# Altium schematic symbol library TI Power Management Shunt Voltage Reference.SchLib: 1526 symbols (part 14 of 18) (continued)
## TLV431BCLPRE3
designator U?
Low-Voltage Adjustable Precision Shunt Regulator, 15 mA, 0 to 70 degC, 3-pin TO-92 (LP), Pb-Free (RoHS); Manufacturer: Texas Instruments; PartNumber: TLV431BCLPRE3; Initial Accuracy @ 25/deg C(%): 0.5; Iout/Iz(Max)(mA): 15; Min Iz for Regulation(uA): 80; Rating: Catalog; SubFamily: Shunt Voltage Reference; Temp Coeff(Max)(ppm/ degree C): 129; VO Adj(Max)(V): 6; VO Adj(Min)(V): 1.24; DatasheetVersion: SLVS139T; PackageVersion: 4040001-2/C; PackageReference: LP3; PackageDescription: Plastic Cylindrical Package, Formed Lead Option (TO-92); Supplier 1: Digi-Key; Supplier Part Number 1: TLV431BCLPRE3-ND; Supplier 2: Mouser; Supplier Part Number 2: 595-TLV431BCLPRE3; Eco-Plan: Pb-Free (RoHS); Mounting Technology: Through Hole; Code_JEDEC: TO-226; ComponentLink1Description: Manufacturer URL; ComponentLink1URL: http://www.ti.com/; ComponentLink2Description: Datasheet; ComponentLink2URL: http://www.ti.com/general/docs/lit/getliterature.tsp?genericPartNumber=TLV431B&fileType=pdf; ComponentLink3Description: Package Specification; ComponentLink3URL: http://www.ti.com/litv/pdf/msot002a; ComponentLink4Description: URL Link1; ComponentLink4URL: Samples URL:http://www.ti.com/general/docs/lit/getliterature.tsp?genericPartNumber=tlv431b&fileType=pdf
footprint TI-LP3 (TO, Flat Index; 3 In-Line, Formed Axial Leads; Body Dia. 4.8mm; Leads 0.56 x 0.41 mm (max))
pins: 1 REF (in), 2 ANODE, 3 CATHODE

## TLV431BCPK
designator U?
Low-Voltage Adjustable Precision Shunt Regulator, 15 mA, 0 to 70 degC, 3-pin SOT-89 (PK), Green (RoHS & no Sb/Br); Manufacturer: Texas Instruments; PartNumber: TLV431BCPK; Initial Accuracy @ 25/deg C(%): 0.5; Iout/Iz(Max)(mA): 15; Min Iz for Regulation(uA): 80; Rating: Catalog; SubFamily: Shunt Voltage Reference; Temp Coeff(Max)(ppm/ degree C): 129; VO Adj(Max)(V): 6; VO Adj(Min)(V): 1.24; DatasheetVersion: SLVS139T; PackageVersion: 4040234/D; PackageReference: PK3; PackageDescription: 3-Pin Plastic Small Outline, Body 2.5 x 4.5 mm, Pitch 1.5 mm; Supplier 1: Digi-Key; Supplier Part Number 1: 296-22934-5-ND; Supplier 2: Mouser; Supplier Part Number 2: 595-TLV431BCPK; Eco-Plan: Green (RoHS & no Sb/Br); Mounting Technology: Surface Mount; Code_JEDEC: TO-243; ComponentLink1Description: Manufacturer URL; ComponentLink1URL: http://www.ti.com/; ComponentLink2Description: Datasheet; ComponentLink2URL: http://www.ti.com/general/docs/lit/getliterature.tsp?genericPartNumber=TLV431B&fileType=pdf; ComponentLink3Description: Package Specification; ComponentLink3URL: http://www.ti.com/litv/pdf/mhsi001b; ComponentLink4Description: URL Link1; ComponentLink4URL: Samples URL:http://www.ti.com/general/docs/lit/getliterature.tsp?genericPartNumber=tlv431b&fileType=pdf
footprint TI-PK3_N (SOT89, 3-Leads, Body 4.5x2.5mm, Pitch 1.5mm, IPC Medium Density)
pins: 1 REF (in), 2 ANODE, 3 CATHODE

## TLV431BCPKG3
designator U?
Low-Voltage Adjustable Precision Shunt Regulator, 15 mA, 0 to 70 degC, 3-pin SOT-89 (PK), Green (RoHS & no Sb/Br); Manufacturer: Texas Instruments; PartNumber: TLV431BCPKG3; Iout/Iz(Max)(mA): 15; Min Iz for Regulation(uA): 80; Rating: Catalog; SubFamily: Shunt Voltage Reference; Temp Coeff(Max)(ppm/ degree C): 129; VO Adj(Max)(V): 6; VO Adj(Min)(V): 1.24; DatasheetVersion: SLVS139T; PackageVersion: 4040234/D; PackageReference: PK3; PackageDescription: 3-Pin Plastic Small Outline, Body 2.5 x 4.5 mm, Pitch 1.5 mm; Supplier 1: Digi-Key; Supplier Part Number 1: 296-19338-2-ND; Supplier 2: Digi-Key; Supplier Part Number 2: 296-19338-1-ND; Supplier 3: Digi-Key; Supplier Part Number 3: 296-19338-6-ND; Supplier 4: Mouser; Supplier Part Number 4: 595-TLV431BCPKG3; Eco-Plan: Green (RoHS & no Sb/Br); Mounting Technology: Surface Mount; Code_JEDEC: TO-243; ComponentLink1Description: Manufacturer URL; ComponentLink1URL: http://www.ti.com/; ComponentLink2Description: Datasheet; ComponentLink2URL: http://www.ti.com/general/docs/lit/getliterature.tsp?genericPartNumber=TLV431B&fileType=pdf; ComponentLink3Description: Package Specification; ComponentLink3URL: http://www.ti.com/litv/pdf/mhsi001b; ComponentLink4Description: URL Link1; ComponentLink4URL: Samples URL:http://www.ti.com/general/docs/lit/getliterature.tsp?genericPartNumber=tlv431b&fileType=pdf
footprint TI-PK3_N (SOT89, 3-Leads, Body 4.5x2.5mm, Pitch 1.5mm, IPC Medium Density)
pins: 1 REF (in), 2 ANODE, 3 CATHODE

## TLV431BIDBVR
designator U?
Low-Voltage Adjustable Precision Shunt Regulator, 15 mA, -40 to 85 degC, 5-pin SOT-23 (DBV), Green (RoHS & no Sb/Br); Manufacturer: Texas Instruments; PartNumber: TLV431BIDBVR; Initial Accuracy @ 25/deg C(%): 0.5; Iout/Iz(Max)(mA): 15; Min Iz for Regulation(uA): 80; Rating: Catalog; SubFamily: Shunt Voltage Reference; Temp Coeff(Max)(ppm/ degree C): 129; VO Adj(Max)(V): 6; VO Adj(Min)(V): 1.24; DatasheetVersion: SLVS139T; PackageVersion: 4073253-4/K; PackageReference: DBV5; PackageDescription: 5-Pin Plastic Small Outline, Body 1.60 ?2.90 mm, Pitch 0.95 mm; Supplier 1: Digi-Key; Supplier Part Number 1: 296-17570-2-ND; Supplier 2: Digi-Key; Supplier Part Number 2: 296-17570-1-ND; Supplier 3: Digi-Key; Supplier Part Number 3: 296-17570-6-ND; Supplier 4: Newark; Supplier Part Number 4: 71J8024; Supplier 5: Mouser; Supplier Part Number 5: 595-TLV431BIDBVR; Eco-Plan: Green (RoHS & no Sb/Br); Mounting Technology: Surface Mount; Code_JEDEC: MO-178; ComponentLink1Description: Manufacturer URL; ComponentLink1URL: http://www.ti.com/; ComponentLink2Description: Datasheet; ComponentLink2URL: http://www.ti.com/general/docs/lit/getliterature.tsp?genericPartNumber=TLV431B&fileType=pdf; ComponentLink3Description: Package Specification; ComponentLink3URL: http://www.ti.com/litv/pdf/mpds018i
footprint TI-DBV5_N (SOT23, 5-Leads, Body 2.9x1.6mm, Pitch 0.95mm, IPC Medium Density)
part A pins: 3 CATHODE, 4 REF (in), 5 ANODE
part B pins: 1 NC, 2 NC

## TLV431BIDBVRE4
designator U?
Low-Voltage Adjustable Precision Shunt Regulator, 15 mA, -40 to 85 degC, 5-pin SOT-23 (DBV), Green (RoHS & no Sb/Br); Manufacturer: Texas Instruments; PartNumber: TLV431BIDBVRE4; Initial Accuracy @ 25/deg C(%): 0.5; Iout/Iz(Max)(mA): 15; Min Iz for Regulation(uA): 80; Rating: Catalog; SubFamily: Shunt Voltage Reference; Temp Coeff(Max)(ppm/ degree C): 129; VO Adj(Max)(V): 6; VO Adj(Min)(V): 1.24; DatasheetVersion: SLVS139T; PackageVersion: 4073253-4/K; PackageReference: DBV5; PackageDescription: 5-Pin Plastic Small Outline, Body 1.60 ?2.90 mm, Pitch 0.95 mm; Supplier 1: Digi-Key; Supplier Part Number 1: TLV431BIDBVRE4-ND; Supplier 2: Mouser; Supplier Part Number 2: 595-TLV431BIDBVRE4; Eco-Plan: Green (RoHS & no Sb/Br); Mounting Technology: Surface Mount; Code_JEDEC: MO-178; ComponentLink1Description: Manufacturer URL; ComponentLink1URL: http://www.ti.com/; ComponentLink2Description: Datasheet; ComponentLink2URL: http://www.ti.com/general/docs/lit/getliterature.tsp?genericPartNumber=TLV431B&fileType=pdf; ComponentLink3Description: Package Specification; ComponentLink3URL: http://www.ti.com/litv/pdf/mpds018i
footprint TI-DBV5_N (SOT23, 5-Leads, Body 2.9x1.6mm, Pitch 0.95mm, IPC Medium Density)
part A pins: 3 CATHODE, 4 REF (in), 5 ANODE
part B pins: 1 NC, 2 NC

## TLV431BIDBVRG4
designator U?
Low-Voltage Adjustable Precision Shunt Regulator, 15 mA, -40 to 85 degC, 5-pin SOT-23 (DBV), Green (RoHS & no Sb/Br); Manufacturer: Texas Instruments; PartNumber: TLV431BIDBVRG4; Initial Accuracy @ 25/deg C(%): 0.5; Iout/Iz(Max)(mA): 15; Min Iz for Regulation(uA): 80; Rating: Catalog; SubFamily: Shunt Voltage Reference; Temp Coeff(Max)(ppm/ degree C): 129; VO Adj(Max)(V): 6; VO Adj(Min)(V): 1.24; DatasheetVersion: SLVS139T; PackageVersion: 4073253-4/K; PackageReference: DBV5; PackageDescription: 5-Pin Plastic Small Outline, Body 1.60 ?2.90 mm, Pitch 0.95 mm; Supplier 1: Digi-Key; Supplier Part Number 1: TLV431BIDBVRG4-ND; Supplier 2: Newark; Supplier Part Number 2: 46M9064; Supplier 3: Mouser; Supplier Part Number 3: 595-TLV431BIDBVRG4; Eco-Plan: Green (RoHS & no Sb/Br); Mounting Technology: Surface Mount; Code_JEDEC: MO-178; ComponentLink1Description: Manufacturer URL; ComponentLink1URL: http://www.ti.com/; ComponentLink2Description: Datasheet; ComponentLink2URL: http://www.ti.com/general/docs/lit/getliterature.tsp?genericPartNumber=TLV431B&fileType=pdf; ComponentLink3Description: Package Specification; ComponentLink3URL: http://www.ti.com/litv/pdf/mpds018i
footprint TI-DBV5_N (SOT23, 5-Leads, Body 2.9x1.6mm, Pitch 0.95mm, IPC Medium Density)
part A pins: 3 CATHODE, 4 REF (in), 5 ANODE
part B pins: 1 NC, 2 NC

## TLV431BIDBVT
designator U?
Low-Voltage Adjustable Precision Shunt Regulator, 15 mA, -40 to 85 degC, 5-pin SOT-23 (DBV), Green (RoHS & no Sb/Br); Manufacturer: Texas Instruments; PartNumber: TLV431BIDBVT; Initial Accuracy @ 25/deg C(%): 0.5; Iout/Iz(Max)(mA): 15; Min Iz for Regulation(uA): 80; Rating: Catalog; SubFamily: Shunt Voltage Reference; Temp Coeff(Max)(ppm/ degree C): 129; VO Adj(Max)(V): 6; VO Adj(Min)(V): 1.24; DatasheetVersion: SLVS139T; PackageVersion: 4073253-4/K; PackageReference: DBV5; PackageDescription: 5-Pin Plastic Small Outline, Body 1.60 ?2.90 mm, Pitch 0.95 mm; Supplier 1: Digi-Key; Supplier Part Number 1: 296-32399-2-ND; Supplier 2: Digi-Key; Supplier Part Number 2: 296-32399-1-ND; Supplier 3: Digi-Key; Supplier Part Number 3: 296-32399-6-ND; Supplier 4: Newark; Supplier Part Number 4: 71J8025; Supplier 5: Mouser; Supplier Part Number 5: 595-TLV431BIDBVT; Eco-Plan: Green (RoHS & no Sb/Br); Mounting Technology: Surface Mount; Code_JEDEC: MO-178; ComponentLink1Description: Manufacturer URL; ComponentLink1URL: http://www.ti.com/; ComponentLink2Description: Datasheet; ComponentLink2URL: http://www.ti.com/general/docs/lit/getliterature.tsp?genericPartNumber=TLV431B&fileType=pdf; ComponentLink3Description: Package Specification; ComponentLink3URL: http://www.ti.com/litv/pdf/mpds018i
footprint TI-DBV5_N (SOT23, 5-Leads, Body 2.9x1.6mm, Pitch 0.95mm, IPC Medium Density)
part A pins: 3 CATHODE, 4 REF (in), 5 ANODE
part B pins: 1 NC, 2 NC

## TLV431BIDBVTE4
designator U?
Low-Voltage Adjustable Precision Shunt Regulator, 15 mA, -40 to 85 degC, 5-pin SOT-23 (DBV), Green (RoHS & no Sb/Br); Manufacturer: Texas Instruments; PartNumber: TLV431BIDBVTE4; Initial Accuracy @ 25/deg C(%): 0.5; Iout/Iz(Max)(mA): 15; Min Iz for Regulation(uA): 80; Rating: Catalog; SubFamily: Shunt Voltage Reference; Temp Coeff(Max)(ppm/ degree C): 129; VO Adj(Max)(V): 6; VO Adj(Min)(V): 1.24; DatasheetVersion: SLVS139T; PackageVersion: 4073253-4/K; PackageReference: DBV5; PackageDescription: 5-Pin Plastic Small Outline, Body 1.60 ?2.90 mm, Pitch 0.95 mm; Supplier 1: Digi-Key; Supplier Part Number 1: TLV431BIDBVTE4-ND; Supplier 2: Mouser; Supplier Part Number 2: 595-TLV431BIDBVTE4; Eco-Plan: Green (RoHS & no Sb/Br); Mounting Technology: Surface Mount; Code_JEDEC: MO-178; ComponentLink1Description: Manufacturer URL; ComponentLink1URL: http://www.ti.com/; ComponentLink2Description: Datasheet; ComponentLink2URL: http://www.ti.com/general/docs/lit/getliterature.tsp?genericPartNumber=TLV431B&fileType=pdf; ComponentLink3Description: Package Specification; ComponentLink3URL: http://www.ti.com/litv/pdf/mpds018i
footprint TI-DBV5_N (SOT23, 5-Leads, Body 2.9x1.6mm, Pitch 0.95mm, IPC Medium Density)
part A pins: 3 CATHODE, 4 REF (in), 5 ANODE
part B pins: 1 NC, 2 NC

## TLV431BIDBVTG4
designator U?
Low-Voltage Adjustable Precision Shunt Regulator, 15 mA, -40 to 85 degC, 5-pin SOT-23 (DBV), Green (RoHS & no Sb/Br); Manufacturer: Texas Instruments; PartNumber: TLV431BIDBVTG4; Initial Accuracy @ 25/deg C(%): 0.5; Iout/Iz(Max)(mA): 15; Min Iz for Regulation(uA): 80; Rating: Catalog; SubFamily: Shunt Voltage Reference; Temp Coeff(Max)(ppm/ degree C): 129; VO Adj(Max)(V): 6; VO Adj(Min)(V): 1.24; DatasheetVersion: SLVS139T; PackageVersion: 4073253-4/K; PackageReference: DBV5; PackageDescription: 5-Pin Plastic Small Outline, Body 1.60 ?2.90 mm, Pitch 0.95 mm; Supplier 1: Digi-Key; Supplier Part Number 1: TLV431BIDBVTG4-ND; Supplier 2: Newark; Supplier Part Number 2: 46M9065; Supplier 3: Mouser; Supplier Part Number 3: 595-TLV431BIDBVTG4; Eco-Plan: Green (RoHS & no Sb/Br); Mounting Technology: Surface Mount; Code_JEDEC: MO-178; ComponentLink1Description: Manufacturer URL; ComponentLink1URL: http://www.ti.com/; ComponentLink2Description: Datasheet; ComponentLink2URL: http://www.ti.com/general/docs/lit/getliterature.tsp?genericPartNumber=TLV431B&fileType=pdf; ComponentLink3Description: Package Specification; ComponentLink3URL: http://www.ti.com/litv/pdf/mpds018i
footprint TI-DBV5_N (SOT23, 5-Leads, Body 2.9x1.6mm, Pitch 0.95mm, IPC Medium Density)
part A pins: 3 CATHODE, 4 REF (in), 5 ANODE
part B pins: 1 NC, 2 NC

## TLV431BIDBZR
designator U?
Low-Voltage Adjustable Precision Shunt Regulator, 15 mA, -40 to 85 degC, 3-pin SOT-23 (DBZ), Green (RoHS & no Sb/Br); Manufacturer: Texas Instruments; PartNumber: TLV431BIDBZR; Initial Accuracy @ 25/deg C(%): 0.5; Iout/Iz(Max)(mA): 15; Min Iz for Regulation(uA): 80; Rating: Catalog; SubFamily: Shunt Voltage Reference; Temp Coeff(Max)(ppm/ degree C): 129; VO Adj(Max)(V): 6; VO Adj(Min)(V): 1.24; DatasheetVersion: SLVS139T; PackageVersion: 4203227/B; PackageReference: DBZ3; PackageDescription: 3-Pin Plastic Small Outline, Body 2.92 x 1.3 mm, Pitch 0.95 mm; Supplier 1: Digi-Key; Supplier Part Number 1: 296-17571-2-ND; Supplier 2: Digi-Key; Supplier Part Number 2: 296-17571-1-ND; Supplier 3: Digi-Key; Supplier Part Number 3: 296-17571-6-ND; Supplier 4: Newark; Supplier Part Number 4: 71J8026; Supplier 5: Mouser; Supplier Part Number 5: 595-TLV431BIDBZR; Eco-Plan: Green (RoHS & no Sb/Br); Mounting Technology: Surface Mount; Code_JEDEC: TO-236; ComponentLink1Description: Manufacturer URL; ComponentLink1URL: http://www.ti.com/; ComponentLink2Description: Datasheet; ComponentLink2URL: http://www.ti.com/general/docs/lit/getliterature.tsp?genericPartNumber=TLV431B&fileType=pdf; ComponentLink3Description: Package Specification; ComponentLink3URL: http://www.ti.com/litv/pdf/mpds108a
footprint TI-DBZ3_N (SOT23, 3-Leads, Body 2.92x1.3 mm, Pitch 0.95 mm, IPC Medium Density)
pins: 1 REF (in), 2 CATHODE, 3 ANODE

## TLV431BIDBZRG4
designator U?
Low-Voltage Adjustable Precision Shunt Regulator, 15 mA, -40 to 85 degC, 3-pin SOT-23 (DBZ), Green (RoHS & no Sb/Br); Manufacturer: Texas Instruments; PartNumber: TLV431BIDBZRG4; Initial Accuracy @ 25/deg C(%): 0.5; Iout/Iz(Max)(mA): 15; Min Iz for Regulation(uA): 80; Rating: Catalog; SubFamily: Shunt Voltage Reference; Temp Coeff(Max)(ppm/ degree C): 129; VO Adj(Max)(V): 6; VO Adj(Min)(V): 1.24; DatasheetVersion: SLVS139T; PackageVersion: 4203227/B; PackageReference: DBZ3; PackageDescription: 3-Pin Plastic Small Outline, Body 2.92 x 1.3 mm, Pitch 0.95 mm; Supplier 1: Digi-Key; Supplier Part Number 1: TLV431BIDBZRG4-ND; Supplier 2: Mouser; Supplier Part Number 2: 595-TLV431BIDBZRG4; Eco-Plan: Green (RoHS & no Sb/Br); Mounting Technology: Surface Mount; Code_JEDEC: TO-236; ComponentLink1Description: Manufacturer URL; ComponentLink1URL: http://www.ti.com/; ComponentLink2Description: Datasheet; ComponentLink2URL: http://www.ti.com/general/docs/lit/getliterature.tsp?genericPartNumber=TLV431B&fileType=pdf; ComponentLink3Description: Package Specification; ComponentLink3URL: http://www.ti.com/litv/pdf/mpds108a
footprint TI-DBZ3_N (SOT23, 3-Leads, Body 2.92x1.3 mm, Pitch 0.95 mm, IPC Medium Density)
pins: 1 REF (in), 2 CATHODE, 3 ANODE

## TLV431BIDBZT
designator U?
Low-Voltage Adjustable Precision Shunt Regulator, 15 mA, -40 to 85 degC, 3-pin SOT-23 (DBZ), Green (RoHS & no Sb/Br); Manufacturer: Texas Instruments; PartNumber: TLV431BIDBZT; Initial Accuracy @ 25/deg C(%): 0.5; Iout/Iz(Max)(mA): 15; Min Iz for Regulation(uA): 80; Rating: Catalog; SubFamily: Shunt Voltage Reference; Temp Coeff(Max)(ppm/ degree C): 129; VO Adj(Max)(V): 6; VO Adj(Min)(V): 1.24; DatasheetVersion: SLVS139T; PackageVersion: 4203227/B; PackageReference: DBZ3; PackageDescription: 3-Pin Plastic Small Outline, Body 2.92 x 1.3 mm, Pitch 0.95 mm; Supplier 1: Digi-Key; Supplier Part Number 1: 296-26828-2-ND; Supplier 2: Digi-Key; Supplier Part Number 2: 296-26828-1-ND; Supplier 3: Digi-Key; Supplier Part Number 3: 296-26828-6-ND; Supplier 4: Newark; Supplier Part Number 4: 71J8027; Supplier 5: Mouser; Supplier Part Number 5: 595-TLV431BIDBZT; Eco-Plan: Green (RoHS & no Sb/Br); Mounting Technology: Surface Mount; Code_JEDEC: TO-236; ComponentLink1Description: Manufacturer URL; ComponentLink1URL: http://www.ti.com/; ComponentLink2Description: Datasheet; ComponentLink2URL: http://www.ti.com/general/docs/lit/getliterature.tsp?genericPartNumber=TLV431B&fileType=pdf; ComponentLink3Description: Package Specification; ComponentLink3URL: http://www.ti.com/litv/pdf/mpds108a
footprint TI-DBZ3_N (SOT23, 3-Leads, Body 2.92x1.3 mm, Pitch 0.95 mm, IPC Medium Density)
pins: 1 REF (in), 2 CATHODE, 3 ANODE

## TLV431BIDBZTG4
designator U?
Low-Voltage Adjustable Precision Shunt Regulator, 15 mA, -40 to 85 degC, 3-pin SOT-23 (DBZ), Green (RoHS & no Sb/Br); Manufacturer: Texas Instruments; PartNumber: TLV431BIDBZTG4; Initial Accuracy @ 25/deg C(%): 0.5; Iout/Iz(Max)(mA): 15; Min Iz for Regulation(uA): 80; Rating: Catalog; SubFamily: Shunt Voltage Reference; Temp Coeff(Max)(ppm/ degree C): 129; VO Adj(Max)(V): 6; VO Adj(Min)(V): 1.24; DatasheetVersion: SLVS139T; PackageVersion: 4203227/B; PackageReference: DBZ3; PackageDescription: 3-Pin Plastic Small Outline, Body 2.92 x 1.3 mm, Pitch 0.95 mm; Supplier 1: Digi-Key; Supplier Part Number 1: TLV431BIDBZTG4-ND; Supplier 2: Farnell; Supplier Part Number 2: 1053372; Supplier 3: Newark; Supplier Part Number 3: 98K1618; Supplier 4: Mouser; Supplier Part Number 4: 595-TLV431BIDBZTG4; Eco-Plan: Green (RoHS & no Sb/Br); Mounting Technology: Surface Mount; Code_JEDEC: TO-236; ComponentLink1Description: Manufacturer URL; ComponentLink1URL: http://www.ti.com/; ComponentLink2Description: Datasheet; ComponentLink2URL: http://www.ti.com/general/docs/lit/getliterature.tsp?genericPartNumber=TLV431B&fileType=pdf; ComponentLink3Description: Package Specification; ComponentLink3URL: http://www.ti.com/litv/pdf/mpds108a
footprint TI-DBZ3_N (SOT23, 3-Leads, Body 2.92x1.3 mm, Pitch 0.95 mm, IPC Medium Density)
pins: 1 REF (in), 2 CATHODE, 3 ANODE

## TLV431BIDCKR
designator U?
Low-Voltage Adjustable Precision Shunt Regulator, 15 mA, -40 to 85 degC, 6-pin SC70 (DCK), Green (RoHS & no Sb/Br); Manufacturer: Texas Instruments; PartNumber: TLV431BIDCKR; Initial Accuracy @ 25/deg C(%): 0.5; Iout/Iz(Max)(mA): 15; Min Iz for Regulation(uA): 80; Rating: Catalog; SubFamily: Shunt Voltage Reference; Temp Coeff(Max)(ppm/ degree C): 129; VO Adj(Max)(V): 6; VO Adj(Min)(V): 1.24; DatasheetVersion: SLVS139T; PackageReference: DCK6; PackageDescription: 6-Pin Plastic Small Outline, Body 2 x 1.25 mm, 0.65 mm Pitch, 2.1 mm Lead Span; Supplier 1: Digi-Key; Supplier Part Number 1: 296-17795-2-ND; Supplier 2: Digi-Key; Supplier Part Number 2: 296-17795-1-ND; Supplier 3: Digi-Key; Supplier Part Number 3: 296-17795-6-ND; Supplier 4: Newark; Supplier Part Number 4: 24K5673; Supplier 5: Mouser; Supplier Part Number 5: 595-TLV431BIDCKR; Eco-Plan: Green (RoHS & no Sb/Br); Mounting Technology: Surface Mount; Code_JEDEC: MO-203; ComponentLink1Description: Manufacturer URL; ComponentLink1URL: http://www.ti.com/; ComponentLink2Description: Datasheet; ComponentLink2URL: http://www.ti.com/general/docs/lit/getliterature.tsp?genericPartNumber=TLV431B&fileType=pdf; ComponentLink3Description: Package Specification; ComponentLink3URL: http://www.ti.com/litv/pdf/mpds114c
footprint TI-DCK6_V (SOT23, 6-Leads, Body 2x1.25mm, Pitch 0.65mm)
part A pins: 1 CATHODE, 3 REF (in), 6 ANODE
part B pins: 2 NC "No internal connection", 4 NC "No internal connection", 5 NC "No internal connection"

## TLV431BIDCKRE4
designator U?
Low-Voltage Adjustable Precision Shunt Regulator, 15 mA, -40 to 85 degC, 6-pin SC70 (DCK), Green (RoHS & no Sb/Br); Manufacturer: Texas Instruments; PartNumber: TLV431BIDCKRE4; Initial Accuracy @ 25/deg C(%): 0.5; Iout/Iz(Max)(mA): 15; Min Iz for Regulation(uA): 80; Rating: Catalog; SubFamily: Shunt Voltage Reference; Temp Coeff(Max)(ppm/ degree C): 129; VO Adj(Max)(V): 6; VO Adj(Min)(V): 1.24; DatasheetVersion: SLVS139T; PackageReference: DCK6; PackageDescription: 6-Pin Plastic Small Outline, Body 2 x 1.25 mm, 0.65 mm Pitch, 2.1 mm Lead Span; Supplier 1: Digi-Key; Supplier Part Number 1: TLV431BIDCKRE4-ND; Supplier 2: Mouser; Supplier Part Number 2: 595-TLV431BIDCKRE4; Eco-Plan: Green (RoHS & no Sb/Br); Mounting Technology: Surface Mount; Code_JEDEC: MO-203; ComponentLink1Description: Manufacturer URL; ComponentLink1URL: http://www.ti.com/; ComponentLink2Description: Datasheet; ComponentLink2URL: http://www.ti.com/general/docs/lit/getliterature.tsp?genericPartNumber=TLV431B&fileType=pdf; ComponentLink3Description: Package Specification; ComponentLink3URL: http://www.ti.com/litv/pdf/mpds114c
footprint TI-DCK6_V (SOT23, 6-Leads, Body 2x1.25mm, Pitch 0.65mm)
part A pins: 1 CATHODE, 3 REF (in), 6 ANODE
part B pins: 2 NC "No internal connection", 4 NC "No internal connection", 5 NC "No internal connection"

## TLV431BIDCKRG4
designator U?
Low-Voltage Adjustable Precision Shunt Regulator, 15 mA, -40 to 85 degC, 6-pin SC70 (DCK), Green (RoHS & no Sb/Br); Manufacturer: Texas Instruments; PartNumber: TLV431BIDCKRG4; Initial Accuracy @ 25/deg C(%): 0.5; Iout/Iz(Max)(mA): 15; Min Iz for Regulation(uA): 80; Rating: Catalog; SubFamily: Shunt Voltage Reference; Temp Coeff(Max)(ppm/ degree C): 129; VO Adj(Max)(V): 6; VO Adj(Min)(V): 1.24; DatasheetVersion: SLVS139T; PackageReference: DCK6; PackageDescription: 6-Pin Plastic Small Outline, Body 2 x 1.25 mm, 0.65 mm Pitch, 2.1 mm Lead Span; Supplier 1: Digi-Key; Supplier Part Number 1: TLV431BIDCKRG4-ND; Supplier 2: Newark; Supplier Part Number 2: 41M5524; Supplier 3: Mouser; Supplier Part Number 3: 595-TLV431BIDCKRG4; Eco-Plan: Green (RoHS & no Sb/Br); Mounting Technology: Surface Mount; Code_JEDEC: MO-203; ComponentLink1Description: Manufacturer URL; ComponentLink1URL: http://www.ti.com/; ComponentLink2Description: Datasheet; ComponentLink2URL: http://www.ti.com/general/docs/lit/getliterature.tsp?genericPartNumber=TLV431B&fileType=pdf; ComponentLink3Description: Package Specification; ComponentLink3URL: http://www.ti.com/litv/pdf/mpds114c; ComponentLink4Description: URL Link1; ComponentLink4URL: Samples URL:http://www.ti.com/general/docs/lit/getliterature.tsp?genericPartNumber=tlv431b&fileType=pdf
footprint TI-DCK6_V (SOT23, 6-Leads, Body 2x1.25mm, Pitch 0.65mm)
part A pins: 1 CATHODE, 3 REF (in), 6 ANODE
part B pins: 2 NC "No internal connection", 4 NC "No internal connection", 5 NC "No internal connection"

## TLV431BIDCKT
designator U?
Low-Voltage Adjustable Precision Shunt Regulator, 15 mA, -40 to 85 degC, 6-pin SC70 (DCK), Green (RoHS & no Sb/Br); Manufacturer: Texas Instruments; PartNumber: TLV431BIDCKT; Initial Accuracy @ 25/deg C(%): 0.5; Iout/Iz(Max)(mA): 15; Min Iz for Regulation(uA): 80; Rating: Catalog; SubFamily: Shunt Voltage Reference; Temp Coeff(Max)(ppm/ degree C): 129; VO Adj(Max)(V): 6; VO Adj(Min)(V): 1.24; DatasheetVersion: SLVS139T; PackageReference: DCK6; PackageDescription: 6-Pin Plastic Small Outline, Body 2 x 1.25 mm, 0.65 mm Pitch, 2.1 mm Lead Span; Supplier 1: Digi-Key; Supplier Part Number 1: 296-32400-2-ND; Supplier 2: Digi-Key; Supplier Part Number 2: 296-32400-1-ND; Supplier 3: Digi-Key; Supplier Part Number 3: 296-32400-6-ND; Supplier 4: Farnell; Supplier Part Number 4: 1053368; Supplier 5: Newark; Supplier Part Number 5: 98K1619; Supplier 6: Newark; Supplier Part Number 6: 24K5674; Supplier 7: Mouser; Supplier Part Number 7: 595-TLV431BIDCKT; Eco-Plan: Green (RoHS & no Sb/Br); Mounting Technology: Surface Mount; Code_JEDEC: MO-203; ComponentLink1Description: Manufacturer URL; ComponentLink1URL: http://www.ti.com/; ComponentLink2Description: Datasheet; ComponentLink2URL: http://www.ti.com/general/docs/lit/getliterature.tsp?genericPartNumber=TLV431B&fileType=pdf; ComponentLink3Description: Package Specification; ComponentLink3URL: http://www.ti.com/litv/pdf/mpds114c
footprint TI-DCK6_V (SOT23, 6-Leads, Body 2x1.25mm, Pitch 0.65mm)
part A pins: 1 CATHODE, 3 REF (in), 6 ANODE
part B pins: 2 NC "No internal connection", 4 NC "No internal connection", 5 NC "No internal connection"

## TLV431BIDCKTE4
designator U?
Low-Voltage Adjustable Precision Shunt Regulator, 15 mA, -40 to 85 degC, 6-pin SC70 (DCK), Green (RoHS & no Sb/Br); Manufacturer: Texas Instruments; PartNumber: TLV431BIDCKTE4; Initial Accuracy @ 25/deg C(%): 0.5; Iout/Iz(Max)(mA): 15; Min Iz for Regulation(uA): 80; Rating: Catalog; SubFamily: Shunt Voltage Reference; Temp Coeff(Max)(ppm/ degree C): 129; VO Adj(Max)(V): 6; VO Adj(Min)(V): 1.24; DatasheetVersion: SLVS139T; PackageReference: DCK6; PackageDescription: 6-Pin Plastic Small Outline, Body 2 x 1.25 mm, 0.65 mm Pitch, 2.1 mm Lead Span; Supplier 1: Digi-Key; Supplier Part Number 1: TLV431BIDCKTE4-ND; Supplier 2: Mouser; Supplier Part Number 2: 595-TLV431BIDCKTE4; Eco-Plan: Green (RoHS & no Sb/Br); Mounting Technology: Surface Mount; Code_JEDEC: MO-203; ComponentLink1Description: Manufacturer URL; ComponentLink1URL: http://www.ti.com/; ComponentLink2Description: Datasheet; ComponentLink2URL: http://www.ti.com/general/docs/lit/getliterature.tsp?genericPartNumber=TLV431B&fileType=pdf; ComponentLink3Description: Package Specification; ComponentLink3URL: http://www.ti.com/litv/pdf/mpds114c
footprint TI-DCK6_V (SOT23, 6-Leads, Body 2x1.25mm, Pitch 0.65mm)
part A pins: 1 CATHODE, 3 REF (in), 6 ANODE
part B pins: 2 NC "No internal connection", 4 NC "No internal connection", 5 NC "No internal connection"

## TLV431BIDCKTG4
designator U?
Low-Voltage Adjustable Precision Shunt Regulator, 15 mA, -40 to 85 degC, 6-pin SC70 (DCK), Green (RoHS & no Sb/Br); Manufacturer: Texas Instruments; PartNumber: TLV431BIDCKTG4; Initial Accuracy @ 25/deg C(%): 0.5; Iout/Iz(Max)(mA): 15; Min Iz for Regulation(uA): 80; Rating: Catalog; SubFamily: Shunt Voltage Reference; Temp Coeff(Max)(ppm/ degree C): 129; VO Adj(Max)(V): 6; VO Adj(Min)(V): 1.24; DatasheetVersion: SLVS139T; PackageReference: DCK6; PackageDescription: 6-Pin Plastic Small Outline, Body 2 x 1.25 mm, 0.65 mm Pitch, 2.1 mm Lead Span; Supplier 1: Digi-Key; Supplier Part Number 1: TLV431BIDCKTG4-ND; Supplier 2: Newark; Supplier Part Number 2: 41M5525; Supplier 3: Mouser; Supplier Part Number 3: 595-TLV431BIDCKTG4; Eco-Plan: Green (RoHS & no Sb/Br); Mounting Technology: Surface Mount; Code_JEDEC: MO-203; ComponentLink1Description: Manufacturer URL; ComponentLink1URL: http://www.ti.com/; ComponentLink2Description: Datasheet; ComponentLink2URL: http://www.ti.com/general/docs/lit/getliterature.tsp?genericPartNumber=TLV431B&fileType=pdf; ComponentLink3Description: Package Specification; ComponentLink3URL: http://www.ti.com/litv/pdf/mpds114c
footprint TI-DCK6_V (SOT23, 6-Leads, Body 2x1.25mm, Pitch 0.65mm)
part A pins: 1 CATHODE, 3 REF (in), 6 ANODE
part B pins: 2 NC "No internal connection", 4 NC "No internal connection", 5 NC "No internal connection"

## TLV431BILP
designator U?
Low-Voltage Adjustable Precision Shunt Regulator, 15 mA, -40 to 85 degC, 3-pin TO-92 (LP), Pb-Free (RoHS); Manufacturer: Texas Instruments; PartNumber: TLV431BILP; Initial Accuracy @ 25/deg C(%): 0.5; Iout/Iz(Max)(mA): 15; Min Iz for Regulation(uA): 80; Rating: Catalog; SubFamily: Shunt Voltage Reference; Temp Coeff(Max)(ppm/ degree C): 129; VO Adj(Max)(V): 6; VO Adj(Min)(V): 1.24; DatasheetVersion: SLVS139T; PackageVersion: 4040001-2/C; PackageReference: LP3; PackageDescription: Plastic Cylindrical Package, Formed Lead Option (TO-92); Supplier 1: Digi-Key; Supplier Part Number 1: 296-31397-ND; Supplier 2: Newark; Supplier Part Number 2: 24K5675; Supplier 3: Mouser; Supplier Part Number 3: 595-TLV431BILP; Eco-Plan: Pb-Free (RoHS); Mounting Technology: Through Hole; Code_JEDEC: TO-226; ComponentLink1Description: Manufacturer URL; ComponentLink1URL: http://www.ti.com/; ComponentLink2Description: Datasheet; ComponentLink2URL: http://www.ti.com/general/docs/lit/getliterature.tsp?genericPartNumber=TLV431B&fileType=pdf; ComponentLink3Description: Package Specification; ComponentLink3URL: http://www.ti.com/litv/pdf/msot002a; ComponentLink4Description: URL Link1; ComponentLink4URL: Samples URL:http://www.ti.com/general/docs/lit/getliterature.tsp?genericPartNumber=tlv431b&fileType=pdf
footprint TI-LP3 (TO, Flat Index; 3 In-Line, Formed Axial Leads; Body Dia. 4.8mm; Leads 0.56 x 0.41 mm (max))
pins: 1 REF (in), 2 ANODE, 3 CATHODE

## TLV431BILPE3
designator U?
Low-Voltage Adjustable Precision Shunt Regulator, 15 mA, -40 to 85 degC, 3-pin TO-92 (LP), Pb-Free (RoHS); Manufacturer: Texas Instruments; PartNumber: TLV431BILPE3; Initial Accuracy @ 25/deg C(%): 0.5; Iout/Iz(Max)(mA): 15; Min Iz for Regulation(uA): 80; Rating: Catalog; SubFamily: Shunt Voltage Reference; Temp Coeff(Max)(ppm/ degree C): 129; VO Adj(Max)(V): 6; VO Adj(Min)(V): 1.24; DatasheetVersion: SLVS139T; PackageVersion: 4040001-2/C; PackageReference: LP3; PackageDescription: Plastic Cylindrical Package, Formed Lead Option (TO-92); Supplier 1: Digi-Key; Supplier Part Number 1: TLV431BILPE3-ND; Supplier 2: Mouser; Supplier Part Number 2: 595-TLV431BILPE3; Eco-Plan: Pb-Free (RoHS); Mounting Technology: Through Hole; Code_JEDEC: TO-226; ComponentLink1Description: Manufacturer URL; ComponentLink1URL: http://www.ti.com/; ComponentLink2Description: Datasheet; ComponentLink2URL: http://www.ti.com/general/docs/lit/getliterature.tsp?genericPartNumber=TLV431B&fileType=pdf; ComponentLink3Description: Package Specification; ComponentLink3URL: http://www.ti.com/litv/pdf/msot002a
footprint TI-LP3 (TO, Flat Index; 3 In-Line, Formed Axial Leads; Body Dia. 4.8mm; Leads 0.56 x 0.41 mm (max))
pins: 1 REF (in), 2 ANODE, 3 CATHODE

## TLV431BILPR
designator U?
Low-Voltage Adjustable Precision Shunt Regulator, 15 mA, -40 to 85 degC, 3-pin TO-92 (LP), Pb-Free (RoHS); Manufacturer: Texas Instruments; PartNumber: TLV431BILPR; Initial Accuracy @ 25/deg C(%): 0.5; Iout/Iz(Max)(mA): 15; Min Iz for Regulation(uA): 80; Rating: Catalog; SubFamily: Shunt Voltage Reference; Temp Coeff(Max)(ppm/ degree C): 129; VO Adj(Max)(V): 6; VO Adj(Min)(V): 1.24; DatasheetVersion: SLVS139T; PackageVersion: 4040001-2/C; PackageReference: LP3; PackageDescription: Plastic Cylindrical Package, Formed Lead Option (TO-92); Supplier 1: Digi-Key; Supplier Part Number 1: 296-17810-2-ND; Supplier 2: Digi-Key; Supplier Part Number 2: 296-17810-1-ND; Supplier 3: Mouser; Supplier Part Number 3: 595-TLV431BILPR; Eco-Plan: Pb-Free (RoHS); Mounting Technology: Through Hole; Code_JEDEC: TO-226; ComponentLink1Description: Manufacturer URL; ComponentLink1URL: http://www.ti.com/; ComponentLink2Description: Datasheet; ComponentLink2URL: http://www.ti.com/general/docs/lit/getliterature.tsp?genericPartNumber=TLV431B&fileType=pdf; ComponentLink3Description: Package Specification; ComponentLink3URL: http://www.ti.com/litv/pdf/msot002a; ComponentLink4Description: URL Link1; ComponentLink4URL: Samples URL:http://www.ti.com/general/docs/lit/getliterature.tsp?genericPartNumber=tlv431b&fileType=pdf
footprint TI-LP3 (TO, Flat Index; 3 In-Line, Formed Axial Leads; Body Dia. 4.8mm; Leads 0.56 x 0.41 mm (max))
pins: 1 REF (in), 2 ANODE, 3 CATHODE

## TLV431BILPRE3
designator U?
Low-Voltage Adjustable Precision Shunt Regulator, 15 mA, -40 to 85 degC, 3-pin TO-92 (LP), Pb-Free (RoHS); Manufacturer: Texas Instruments; PartNumber: TLV431BILPRE3; Initial Accuracy @ 25/deg C(%): 0.5; Iout/Iz(Max)(mA): 15; Min Iz for Regulation(uA): 80; Rating: Catalog; SubFamily: Shunt Voltage Reference; Temp Coeff(Max)(ppm/ degree C): 129; VO Adj(Max)(V): 6; VO Adj(Min)(V): 1.24; DatasheetVersion: SLVS139T; PackageVersion: 4040001-2/C; PackageReference: LP3; PackageDescription: Plastic Cylindrical Package, Formed Lead Option (TO-92); Supplier 1: Digi-Key; Supplier Part Number 1: TLV431BILPRE3-ND; Supplier 2: Mouser; Supplier Part Number 2: 595-TLV431BILPRE3; Eco-Plan: Pb-Free (RoHS); Mounting Technology: Through Hole; Code_JEDEC: TO-226; ComponentLink1Description: Manufacturer URL; ComponentLink1URL: http://www.ti.com/; ComponentLink2Description: Datasheet; ComponentLink2URL: http://www.ti.com/general/docs/lit/getliterature.tsp?genericPartNumber=TLV431B&fileType=pdf; ComponentLink3Description: Package Specification; ComponentLink3URL: http://www.ti.com/litv/pdf/msot002a; ComponentLink4Description: URL Link1; ComponentLink4URL: Samples URL:http://www.ti.com/general/docs/lit/getliterature.tsp?genericPartNumber=tlv431b&fileType=pdf
footprint TI-LP3 (TO, Flat Index; 3 In-Line, Formed Axial Leads; Body Dia. 4.8mm; Leads 0.56 x 0.41 mm (max))
pins: 1 REF (in), 2 ANODE, 3 CATHODE

## TLV431BIPK
designator U?
Low-Voltage Adjustable Precision Shunt Regulator, 15 mA, -40 to 85 degC, 3-pin SOT-89 (PK), Green (RoHS & no Sb/Br); Manufacturer: Texas Instruments; PartNumber: TLV431BIPK; Initial Accuracy @ 25/deg C(%): 0.5; Iout/Iz(Max)(mA): 15; Min Iz for Regulation(uA): 80; Rating: Catalog; SubFamily: Shunt Voltage Reference; Temp Coeff(Max)(ppm/ degree C): 129; VO Adj(Max)(V): 6; VO Adj(Min)(V): 1.24; DatasheetVersion: SLVS139T; PackageVersion: 4040234/D; PackageReference: PK3; PackageDescription: 3-Pin Plastic Small Outline, Body 2.5 x 4.5 mm, Pitch 1.5 mm; Supplier 1: Digi-Key; Supplier Part Number 1: 296-22935-5-ND; Supplier 2: Mouser; Supplier Part Number 2: 595-TLV431BIPK; Eco-Plan: Green (RoHS & no Sb/Br); Mounting Technology: Surface Mount; Code_JEDEC: TO-243; ComponentLink1Description: Manufacturer URL; ComponentLink1URL: http://www.ti.com/; ComponentLink2Description: Datasheet; ComponentLink2URL: http://www.ti.com/general/docs/lit/getliterature.tsp?genericPartNumber=TLV431B&fileType=pdf; ComponentLink3Description: Package Specification; ComponentLink3URL: http://www.ti.com/litv/pdf/mhsi001b; ComponentLink4Description: URL Link1; ComponentLink4URL: Samples URL:http://www.ti.com/general/docs/lit/getliterature.tsp?genericPartNumber=tlv431b&fileType=pdf
footprint TI-PK3_N (SOT89, 3-Leads, Body 4.5x2.5mm, Pitch 1.5mm, IPC Medium Density)
pins: 1 REF (in), 2 ANODE, 3 CATHODE